# Altium footprint library SMT.PcbLib: 379 footprints (part 13 of 24)
Each footprint in its own frame and in the unit in brackets; x right, y up, seen from the top. Pads: shape width x height; smd on the part's side, far side on the other; paste and mask are expansions set on the pad; w line width, h text height; cw(c..) or ccw(c..) is an arc to the next point about the centre after c.
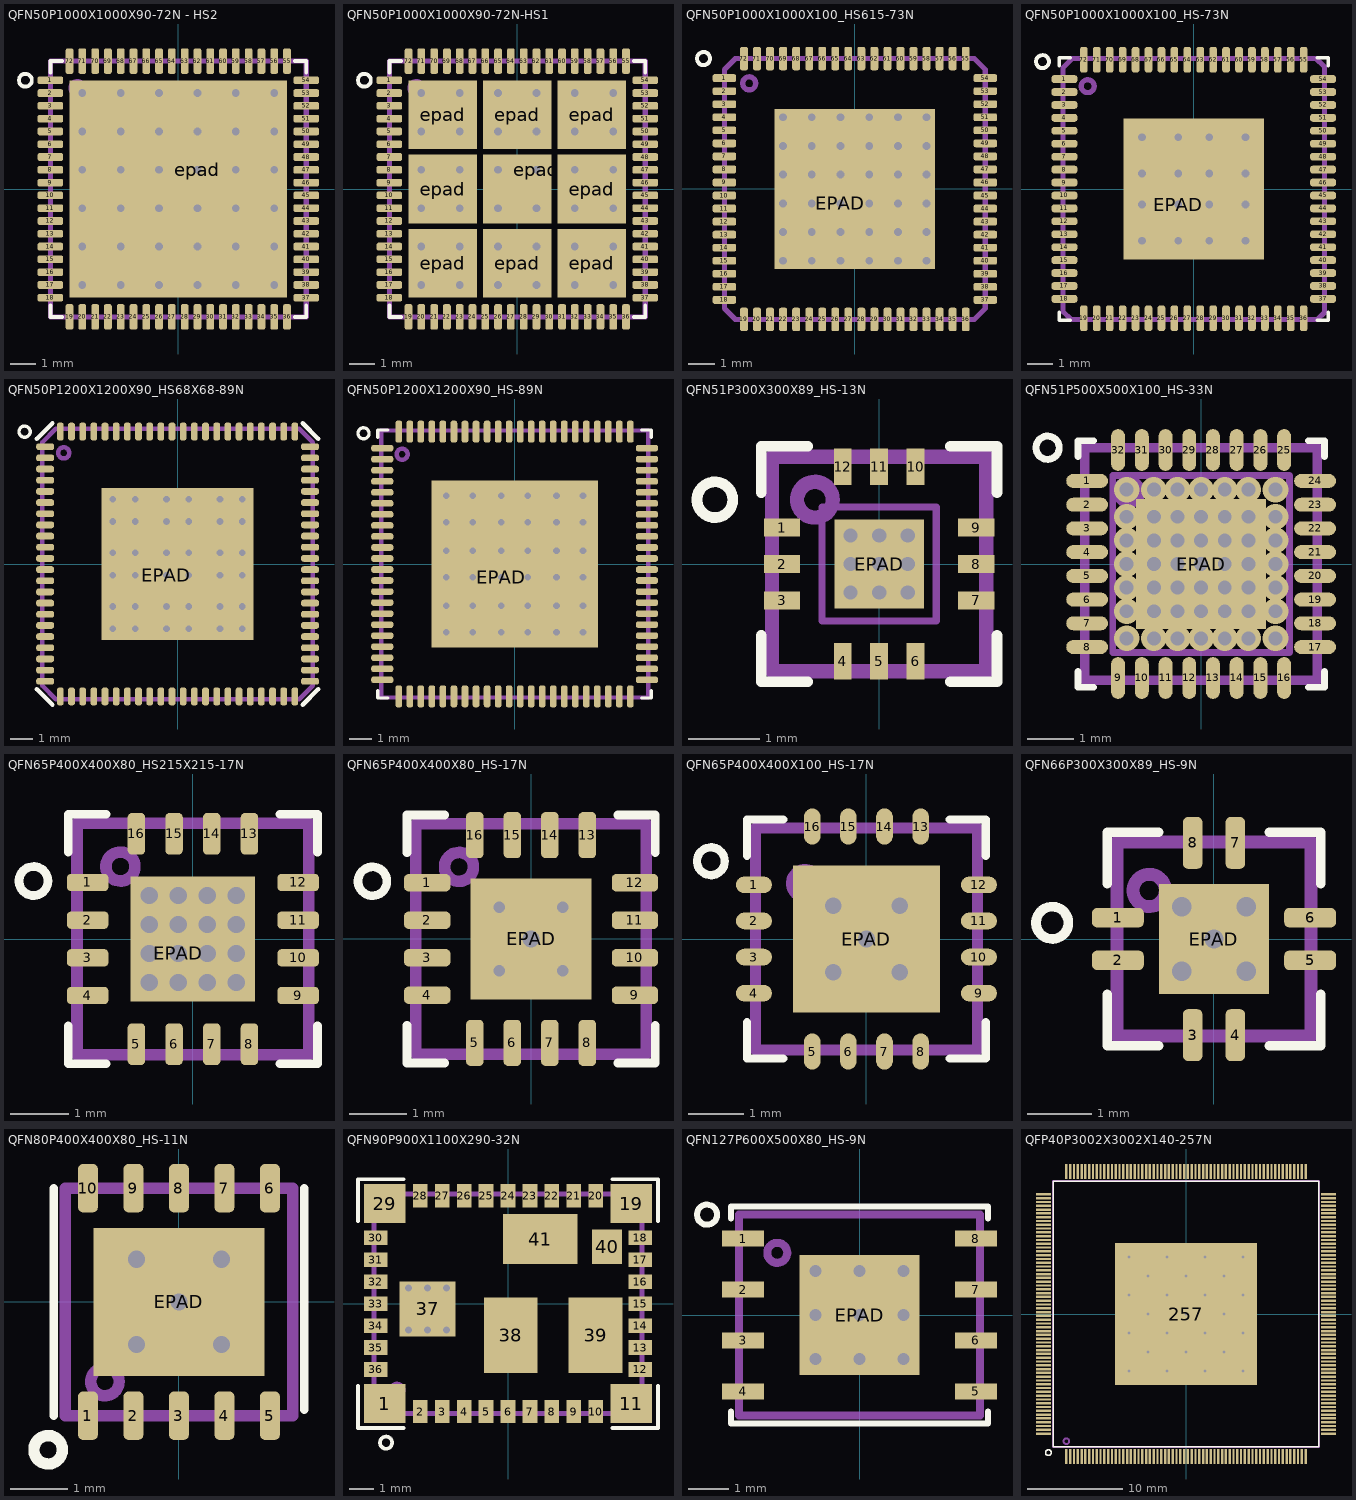
[diagram p12: the footprints below, top view; thin cyan lines are the x and y axes]

## QFN50P1000X1000X90-72N - HS2 [mm] "QFN, 72-Leads, Body 10,0x10,0mm (max), Pitch 0,50mm, IPC Medium Density"
height 0.9
pads (73):
  rrect50% 1x0.3 smd mask+0.03: 1(-5,4.25) 2(-5,3.75) 3(-5,3.25) 4(-5,2.75) 5(-5,2.25) 6(-5,1.75) 7(-5,1.25) 8(-5,0.75) 9(-5,0.25) 10(-5,-0.25) 11(-5,-0.75) 12(-5,-1.25) 13(-5,-1.75) 14(-5,-2.25) 15(-5,-2.75) 16(-5,-3.25) 17(-5,-3.75) 18(-5,-4.25) 37(5,-4.25) 38(5,-3.75) 39(5,-3.25) 40(5,-2.75) 41(5,-2.25) 42(5,-1.75) 43(5,-1.25) 44(5,-0.75) 45(5,-0.25) 46(5,0.25) 47(5,0.75) 48(5,1.25) 49(5,1.75) 50(5,2.25) 51(5,2.75) 52(5,3.25) 53(5,3.75) 54(5,4.25)
  rrect50% 0.3x1 smd mask+0.03: 19(-4.25,-5) 20(-3.75,-5) 21(-3.25,-5) 22(-2.75,-5) 23(-2.25,-5) 24(-1.75,-5) 25(-1.25,-5) 26(-0.75,-5) 27(-0.25,-5) 28(0.25,-5) 29(0.75,-5) 30(1.25,-5) 31(1.75,-5) 32(2.25,-5) 33(2.75,-5) 34(3.25,-5) 35(3.75,-5) 36(4.25,-5) 55(4.25,5) 56(3.75,5) 57(3.25,5) 58(2.75,5) 59(2.25,5) 60(1.75,5) 61(1.25,5) 62(0.75,5) 63(0.25,5) 64(-0.25,5) 65(-0.75,5) 66(-1.25,5) 67(-1.75,5) 68(-2.25,5) 69(-2.75,5) 70(-3.25,5) 71(-3.75,5) 72(-4.25,5)
  rect 8.5x8.5 hole 0.3 copper offset -0.75,-0.75 paste+0 mask-30: epad(0.75,0.75)
via -2.25,-0.75 diameter 0.6 hole 0.3
via -3.75,-0.75 diameter 0.6 hole 0.3
via -0.75,0.75 diameter 0.6 hole 0.3
via -0.75,-0.75 diameter 0.6 hole 0.3
via 0.75,-0.75 diameter 0.6 hole 0.3
via -2.25,0.75 diameter 0.6 hole 0.3
via -3.75,0.75 diameter 0.6 hole 0.3
via 2.25,0.75 diameter 0.6 hole 0.3
via 3.75,0.75 diameter 0.6 hole 0.3
via 2.25,-0.75 diameter 0.6 hole 0.3
via 3.75,-0.75 diameter 0.6 hole 0.3
via -3.75,2.25 diameter 0.6 hole 0.3
via -3.75,3.75 diameter 0.6 hole 0.3
via -2.25,2.25 diameter 0.6 hole 0.3
via -2.25,3.75 diameter 0.6 hole 0.3
via -0.75,2.25 diameter 0.6 hole 0.3
via -0.75,3.75 diameter 0.6 hole 0.3
via 0.75,2.25 diameter 0.6 hole 0.3
via 0.75,3.75 diameter 0.6 hole 0.3
via 2.25,2.25 diameter 0.6 hole 0.3
via 2.25,3.75 diameter 0.6 hole 0.3
via 3.75,2.25 diameter 0.6 hole 0.3
via 3.75,3.75 diameter 0.6 hole 0.3
via 3.75,-2.25 diameter 0.6 hole 0.3
via 3.75,-3.75 diameter 0.6 hole 0.3
via 2.25,-2.25 diameter 0.6 hole 0.3
via 2.25,-3.75 diameter 0.6 hole 0.3
via 0.75,-2.25 diameter 0.6 hole 0.3
via 0.75,-3.75 diameter 0.6 hole 0.3
via -0.75,-2.25 diameter 0.6 hole 0.3
via -0.75,-3.75 diameter 0.6 hole 0.3
via -2.25,-2.25 diameter 0.6 hole 0.3
via -2.25,-3.75 diameter 0.6 hole 0.3
via -3.75,-2.25 diameter 0.6 hole 0.3
via -3.75,-3.75 diameter 0.6 hole 0.3
Top Overlay:
  circle w0.15: c-5.975,4.25 r0.25
  lines w0.15: -5,-4.55 -5,-5 -4.55,-5 ; -5,4.55 -5,5 -4.55,5 ; 4.55,-5 5,-5 5,-4.55 ; 4.55,5 5,5 5,4.55
Top Paste:
  region: -1.05,-1.85 -1.05,-3.95 1.05,-3.95 1.05,-1.85
  region: 1.86,3.96 1.86,1.86 3.96,1.86 3.96,3.96
  region: -1.05,3.96 -1.05,1.86 1.05,1.86 1.05,3.96
  region: -3.94,3.96 -3.94,1.86 -1.84,1.86 -1.84,3.96
  region: -1.05,1.05 -1.05,-1.05 1.05,-1.05 1.05,1.05
  region: 1.86,1.05 1.86,-1.05 3.96,-1.05 3.96,1.05
  region: -3.94,1.05 -3.94,-1.05 -1.84,-1.05 -1.84,1.05
  region: 1.86,-1.85 1.86,-3.95 3.96,-3.95 3.96,-1.85
  region: -3.94,-1.85 -3.94,-3.95 -1.84,-3.95 -1.84,-1.85
Top Solder:
  region: -4.3,-1.52 -4.3,-4.3 -1.52,-4.3 -1.52,-1.52
  region: -1.39,-1.52 -1.39,-4.3 1.39,-4.3 1.39,-1.52
  region: 1.52,-1.52 1.52,-4.3 4.3,-4.3 4.3,-1.52
  region: 1.52,1.39 1.52,-1.39 4.3,-1.39 4.3,1.39
  region: 1.52,4.3 1.52,1.52 4.3,1.52 4.3,4.3
  region: -1.39,4.3 -1.39,1.52 1.39,1.52 1.39,4.3
  region: -4.3,4.3 -4.3,1.52 -1.52,1.52 -1.52,4.3
  region: -4.3,1.38 -4.3,-1.4 -1.52,-1.4 -1.52,1.38
  region: -1.39,1.39 -1.39,-1.39 1.39,-1.39 1.39,1.39
Bottom Solder:
  region: -4.25,4.25 4.25,4.25 4.25,-4.25 -4.25,-4.25
Mechanical 1:
  circle w0.2: c-3.95,3.95 r0.25
  lines w0.2: -5,-5 -5,5 5,5 5,-5 -5,-5
3D body: height 0.9, standoff 0.05, extent -5,-5 5,5

## QFN50P1000X1000X90-72N-HS1 [mm] "QFN, 72-Leads, Body 10,0x10,0mm (max), Pitch 0,50mm, IPC Medium Density"
height 0.9
pads (81):
  rrect50% 1x0.3 smd mask+0.03: 1(-5,4.25) 2(-5,3.75) 3(-5,3.25) 4(-5,2.75) 5(-5,2.25) 6(-5,1.75) 7(-5,1.25) 8(-5,0.75) 9(-5,0.25) 10(-5,-0.25) 11(-5,-0.75) 12(-5,-1.25) 13(-5,-1.75) 14(-5,-2.25) 15(-5,-2.75) 16(-5,-3.25) 17(-5,-3.75) 18(-5,-4.25) 37(5,-4.25) 38(5,-3.75) 39(5,-3.25) 40(5,-2.75) 41(5,-2.25) 42(5,-1.75) 43(5,-1.25) 44(5,-0.75) 45(5,-0.25) 46(5,0.25) 47(5,0.75) 48(5,1.25) 49(5,1.75) 50(5,2.25) 51(5,2.75) 52(5,3.25) 53(5,3.75) 54(5,4.25)
  rrect50% 0.3x1 smd mask+0.03: 19(-4.25,-5) 20(-3.75,-5) 21(-3.25,-5) 22(-2.75,-5) 23(-2.25,-5) 24(-1.75,-5) 25(-1.25,-5) 26(-0.75,-5) 27(-0.25,-5) 28(0.25,-5) 29(0.75,-5) 30(1.25,-5) 31(1.75,-5) 32(2.25,-5) 33(2.75,-5) 34(3.25,-5) 35(3.75,-5) 36(4.25,-5) 55(4.25,5) 56(3.75,5) 57(3.25,5) 58(2.75,5) 59(2.25,5) 60(1.75,5) 61(1.25,5) 62(0.75,5) 63(0.25,5) 64(-0.25,5) 65(-0.75,5) 66(-1.25,5) 67(-1.75,5) 68(-2.25,5) 69(-2.75,5) 70(-3.25,5) 71(-3.75,5) 72(-4.25,5)
  rect 2.68x2.68 smd paste-0.39 mask+0.05: epad(-2.91,-2.91) epad(-2.91,0) epad(-2.91,2.91) epad(0,-2.91) epad(0,2.91) epad(2.91,-2.91) epad(2.91,0) epad(2.91,2.91)
  rect 2.68x2.68 / inner rect 8.5x8.5 / far side rect 8.5x8.5 hole 0.3 copper offset -0.75,-0.75 paste+0 mask+0.05: epad(0.75,0.75)
via -3.75,-3.75 diameter 0.6 hole 0.3
via -3.75,-2.25 diameter 0.6 hole 0.3
via -2.25,-3.75 diameter 0.6 hole 0.3
via -2.25,-2.25 diameter 0.6 hole 0.3
via -0.75,-3.75 diameter 0.6 hole 0.3
via -0.75,-2.25 diameter 0.6 hole 0.3
via 0.75,-3.75 diameter 0.6 hole 0.3
via 0.75,-2.25 diameter 0.6 hole 0.3
via 2.25,-3.75 diameter 0.6 hole 0.3
via 2.25,-2.25 diameter 0.6 hole 0.3
via 3.75,-3.75 diameter 0.6 hole 0.3
via 3.75,-2.25 diameter 0.6 hole 0.3
via 3.75,3.75 diameter 0.6 hole 0.3
via 3.75,2.25 diameter 0.6 hole 0.3
via 2.25,3.75 diameter 0.6 hole 0.3
via 2.25,2.25 diameter 0.6 hole 0.3
via 0.75,3.75 diameter 0.6 hole 0.3
via 0.75,2.25 diameter 0.6 hole 0.3
via -0.75,3.75 diameter 0.6 hole 0.3
via -0.75,2.25 diameter 0.6 hole 0.3
via -2.25,3.75 diameter 0.6 hole 0.3
via -2.25,2.25 diameter 0.6 hole 0.3
via -3.75,3.75 diameter 0.6 hole 0.3
via -3.75,2.25 diameter 0.6 hole 0.3
via 3.75,-0.75 diameter 0.6 hole 0.3
via 2.25,-0.75 diameter 0.6 hole 0.3
via 3.75,0.75 diameter 0.6 hole 0.3
via 2.25,0.75 diameter 0.6 hole 0.3
via -3.75,0.75 diameter 0.6 hole 0.3
via -2.25,0.75 diameter 0.6 hole 0.3
via 0.75,-0.75 diameter 0.6 hole 0.3
via -0.75,-0.75 diameter 0.6 hole 0.3
via -0.75,0.75 diameter 0.6 hole 0.3
via -3.75,-0.75 diameter 0.6 hole 0.3
via -2.25,-0.75 diameter 0.6 hole 0.3
Top Overlay:
  circle w0.15: c-5.975,4.25 r0.25
  lines w0.15: -5,-4.55 -5,-5 -4.55,-5 ; -5,4.55 -5,5 -4.55,5 ; 4.55,-5 5,-5 5,-4.55 ; 4.55,5 5,5 5,4.55
Top Paste:
  region: -0.95,0.95 -0.95,-0.95 0.95,-0.95 0.95,0.95
Top Solder:
  rectangle: -5,-5 -4.375,-4.375
  region: 5,-5 5,-4.375 4.375,-4.375 4.375,-5
  region: 5,5 4.375,5 4.375,4.375 5,4.375
  region: -5,5 -5,4.375 -4.375,4.375 -4.375,5
Bottom Solder:
  region: -4.25,4.25 4.25,4.25 4.25,-4.25 -4.25,-4.25
Mechanical 1:
  circle w0.2: c-3.95,3.95 r0.25
  lines w0.2: -5,-5 5,-5 5,5 -5,5 -5,-5
3D body: height 0.9, standoff 0.05, extent -5,-5 5,5

## QFN50P1000X1000X100_HS615-73N [mm] "QFN, 72-Leads, Body 10,00x10,00mm, Pitch 0,50mm, Thermal Pad 6,15x6,15mm, IPC Medium Density"
height 1
pads (73):
  rrect50% 0.9x0.3 smd mask+0.05: 1(-5,4.25) 2(-5,3.75) 3(-5,3.25) 4(-5,2.75) 5(-5,2.25) 6(-5,1.75) 7(-5,1.25) 8(-5,0.75) 9(-5,0.25) 10(-5,-0.25) 11(-5,-0.75) 12(-5,-1.25) 13(-5,-1.75) 14(-5,-2.25) 15(-5,-2.75) 16(-5,-3.25) 17(-5,-3.75) 18(-5,-4.25) 37(5,-4.25) 38(5,-3.75) 39(5,-3.25) 40(5,-2.75) 41(5,-2.25) 42(5,-1.75) 43(5,-1.25) 44(5,-0.75) 45(5,-0.25) 46(5,0.25) 47(5,0.75) 48(5,1.25) 49(5,1.75) 50(5,2.25) 51(5,2.75) 52(5,3.25) 53(5,3.75) 54(5,4.25)
  rrect50% 0.3x0.9 smd mask+0.05: 19(-4.25,-5) 20(-3.75,-5) 21(-3.25,-5) 22(-2.75,-5) 23(-2.25,-5) 24(-1.75,-5) 25(-1.25,-5) 26(-0.75,-5) 27(-0.25,-5) 28(0.25,-5) 29(0.75,-5) 30(1.25,-5) 31(1.75,-5) 32(2.25,-5) 33(2.75,-5) 34(3.25,-5) 35(3.75,-5) 36(4.25,-5) 55(4.25,5) 56(3.75,5) 57(3.25,5) 58(2.75,5) 59(2.25,5) 60(1.75,5) 61(1.25,5) 62(0.75,5) 63(0.25,5) 64(-0.25,5) 65(-0.75,5) 66(-1.25,5) 67(-1.75,5) 68(-2.25,5) 69(-2.75,5) 70(-3.25,5) 71(-3.75,5) 72(-4.25,5)
  rect 6.15x6.15 hole 0.3 copper offset 0.55,0.55 mask+0.05: EPAD(-0.55,-0.55)
via 2.75,2.75 diameter 0.6 hole 0.3
via 2.75,-2.75 diameter 0.6 hole 0.3
via 1.65,-2.75 diameter 0.6 hole 0.3
via 0.55,-2.75 diameter 0.6 hole 0.3
via -0.55,-2.75 diameter 0.6 hole 0.3
via -1.65,-2.75 diameter 0.6 hole 0.3
via -2.75,-2.75 diameter 0.6 hole 0.3
via 2.75,-1.65 diameter 0.6 hole 0.3
via 1.65,-1.65 diameter 0.6 hole 0.3
via 0.55,-1.65 diameter 0.6 hole 0.3
via -0.55,-1.65 diameter 0.6 hole 0.3
via -1.65,-1.65 diameter 0.6 hole 0.3
via -2.75,-1.65 diameter 0.6 hole 0.3
via 2.75,-0.55 diameter 0.6 hole 0.3
via 1.65,-0.55 diameter 0.6 hole 0.3
via 0.55,-0.55 diameter 0.6 hole 0.3
via -1.65,-0.55 diameter 0.6 hole 0.3
via -2.75,-0.55 diameter 0.6 hole 0.3
via 2.75,0.55 diameter 0.6 hole 0.3
via 1.65,0.55 diameter 0.6 hole 0.3
via 0.55,0.55 diameter 0.6 hole 0.3
via -0.55,0.55 diameter 0.6 hole 0.3
via -1.65,0.55 diameter 0.6 hole 0.3
via -2.75,0.55 diameter 0.6 hole 0.3
via 2.75,1.65 diameter 0.6 hole 0.3
via 1.65,1.65 diameter 0.6 hole 0.3
via 0.55,1.65 diameter 0.6 hole 0.3
via -0.55,1.65 diameter 0.6 hole 0.3
via -1.65,1.65 diameter 0.6 hole 0.3
via -2.75,1.65 diameter 0.6 hole 0.3
via 1.65,2.75 diameter 0.6 hole 0.3
via 0.55,2.75 diameter 0.6 hole 0.3
via -0.55,2.75 diameter 0.6 hole 0.3
via -1.65,2.75 diameter 0.6 hole 0.3
via -2.75,2.75 diameter 0.6 hole 0.3
Top Overlay:
  circle w0.15: c-5.8,5 r0.25
Top Paste:
  rectangle: -2.5,0.5 -0.5,2.5
  rectangle: -2.5,-2.5 -0.5,-0.5
  region: 2.5,-0.5 0.5,-0.5 0.5,-2.5 2.5,-2.5
  region: 2.5,2.5 0.5,2.5 0.5,0.5 2.5,0.5
Top Solder:
  region: 2.8,-2.8 0.2,-2.8 0.2,-0.2 2.8,-0.2
  region: -2.8,-2.8 -0.2,-2.8 -0.2,-0.2 -2.8,-0.2
  region: -2.8,2.8 -0.2,2.8 -0.2,0.2 -2.8,0.2
  region: 2.8,2.8 0.2,2.8 0.2,0.2 2.8,0.2
Mechanical 1:
  circle w0.2: c-4.05,4.05 r0.25
  lines w0.2: -5,-4.58 -5,4.58 -4.58,5 4.58,5 5,4.58 5,-4.58 4.58,-5 -4.58,-5 -5,-4.58
3D body "QFN50P1000X1000X100_HS-73N.step": height 1, standoff 0, extent -5.02,-5.02 5.02,5.02

## QFN50P1000X1000X100_HS-73N [mm] "QFN, 72-Leads, Body 10,00x10,00mm, Pitch 0,50mm, Thermal Pad 5,45x5,45mm, IPC Medium Density"
height 1
pads (73):
  rrect70% 1x0.3 smd paste+0 mask+0.03: 1(-5,4.25) 18(-5,-4.25) 37(5,-4.25) 54(5,4.25)
  rrect70% 1x0.3 smd paste+0 mask+0.04: 2(-5,3.75) 3(-5,3.25) 4(-5,2.75) 5(-5,2.25) 6(-5,1.75) 7(-5,1.25) 8(-5,0.75) 9(-5,0.25) 10(-5,-0.25) 11(-5,-0.75) 12(-5,-1.25) 13(-5,-1.75) 14(-5,-2.25) 15(-5,-2.75) 16(-5,-3.25) 17(-5,-3.75) 38(5,-3.75) 39(5,-3.25) 40(5,-2.75) 41(5,-2.25) 42(5,-1.75) 43(5,-1.25) 44(5,-0.75) 45(5,-0.25) 46(5,0.25) 47(5,0.75) 48(5,1.25) 49(5,1.75) 50(5,2.25) 51(5,2.75) 52(5,3.25) 53(5,3.75)
  rrect70% 0.3x1 smd paste+0 mask+0.03: 19(-4.25,-5) 36(4.25,-5) 55(4.25,5) 72(-4.25,5)
  rrect70% 0.3x1 smd paste+0 mask+0.04: 20(-3.75,-5) 21(-3.25,-5) 22(-2.75,-5) 23(-2.25,-5) 24(-1.75,-5) 25(-1.25,-5) 26(-0.75,-5) 27(-0.25,-5) 28(0.25,-5) 29(0.75,-5) 30(1.25,-5) 31(1.75,-5) 32(2.25,-5) 33(2.75,-5) 34(3.25,-5) 35(3.75,-5) 56(3.75,5) 57(3.25,5) 58(2.75,5) 59(2.25,5) 60(1.75,5) 61(1.25,5) 62(0.75,5) 63(0.25,5) 64(-0.25,5) 65(-0.75,5) 66(-1.25,5) 67(-1.75,5) 68(-2.25,5) 69(-2.75,5) 70(-3.25,5) 71(-3.75,5)
  rect 5.45x5.45 hole 0.3 copper offset 0.6,0.6 mask-20: EPAD(-0.6,-0.6)
via 2,-2 diameter 0.7 hole 0.3
via 0.6,-2 diameter 0.7 hole 0.3
via -0.6,-2 diameter 0.7 hole 0.3
via -2,-2 diameter 0.7 hole 0.3
via 2,2 diameter 0.7 hole 0.3
via 0.6,2 diameter 0.7 hole 0.3
via -0.6,2 diameter 0.7 hole 0.3
via -2,2 diameter 0.7 hole 0.3
via -0.6,0.6 diameter 0.7 hole 0.3
via -2,0.6 diameter 0.7 hole 0.3
via -2,-0.6 diameter 0.7 hole 0.3
via 2,-0.6 diameter 0.7 hole 0.3
via 2,0.6 diameter 0.7 hole 0.3
via 0.6,0.6 diameter 0.7 hole 0.3
via 0.6,-0.6 diameter 0.7 hole 0.3
Top Overlay:
  circle w0.15: c-5.85,4.925 r0.25
  lines w0.15: -5.2,-4.775 -5.2,-5.075 -4.775,-5.075 ; -5.2,4.775 -5.2,5.075 -4.775,5.075 ; 4.775,-5.075 5.2,-5.075 5.2,-4.775 ; 4.775,5.075 5.2,5.075 5.2,4.775
Top Paste:
  rectangle: 0.3,-2.3 2.3,-0.3
  rectangle: -2.3,-2.3 -0.3,-0.3
  rectangle: 0.3,0.3 2.3,2.3
  rectangle: -2.3,0.3 -0.3,2.3
Top Solder:
  region: -2.45,2.45 -0.15,2.45 -0.15,0.15 -2.45,0.15
  region: -2.45,-0.15 -0.15,-0.15 -0.15,-2.45 -2.45,-2.45
  region: 0.15,2.45 2.45,2.45 2.45,0.15 0.15,0.15
  region: 0.15,-0.15 2.45,-0.15 2.45,-2.45 0.15,-2.45
Bottom Solder:
  rectangle: -2.75,-2.75 2.75,2.75
Mechanical 1:
  circle w0.2: c-4.1,3.975 r0.25
  lines w0.2: -5.05,-4.75 -5.05,4.7 -4.7,5.05 4.725,5.05 5.05,4.725 5.05,-4.775 4.775,-5.05 -4.75,-5.05 -5.05,-4.75
3D body "QFN50P1000X975X100_HS-73N.step": height 1, standoff 0, extent -5.02,-4.895 5.02,4.895

## QFN50P1200X1200X90_HS68X68-89N [mm] "QFN, 88-Leads, Body 12,00x12,00mm, Pitch 0,50mm, Thermal Pad 6,8x6,8mm, IPC Medium Density"
height 0.9
pads (89):
  rrect70% 0.8x0.3 smd paste+0 mask+0.04: 1(-5.93,5.25) 2(-5.93,4.75) 3(-5.93,4.25) 4(-5.93,3.75) 5(-5.93,3.25) 6(-5.93,2.75) 7(-5.93,2.25) 8(-5.93,1.75) 9(-5.93,1.25) 10(-5.93,0.75) 11(-5.93,0.25) 12(-5.93,-0.25) 13(-5.93,-0.75) 14(-5.93,-1.25) 15(-5.93,-1.75) 16(-5.93,-2.25) 17(-5.93,-2.75) 18(-5.93,-3.25) 19(-5.93,-3.75) 20(-5.93,-4.25) 21(-5.93,-4.75) 22(-5.93,-5.25) 45(5.93,-5.25) 46(5.93,-4.75) 47(5.93,-4.25) 48(5.93,-3.75) 49(5.93,-3.25) 50(5.93,-2.75) 51(5.93,-2.25) 52(5.93,-1.75) 53(5.93,-1.25) 54(5.93,-0.75) 55(5.93,-0.25) 56(5.93,0.25) 57(5.93,0.75) 58(5.93,1.25) 59(5.93,1.75) 60(5.93,2.25) 61(5.93,2.75) 62(5.93,3.25) 63(5.93,3.75) 64(5.93,4.25) 65(5.93,4.75) 66(5.93,5.25)
  rrect70% 0.3x0.8 smd paste+0 mask+0.04: 23(-5.25,-5.93) 24(-4.75,-5.93) 25(-4.25,-5.93) 26(-3.75,-5.93) 27(-3.25,-5.93) 28(-2.75,-5.93) 29(-2.25,-5.93) 30(-1.75,-5.93) 31(-1.25,-5.93) 32(-0.75,-5.93) 33(-0.25,-5.93) 34(0.25,-5.93) 35(0.75,-5.93) 36(1.25,-5.93) 37(1.75,-5.93) 38(2.25,-5.93) 39(2.75,-5.93) 40(3.25,-5.93) 41(3.75,-5.93) 42(4.25,-5.93) 43(4.75,-5.93) 44(5.25,-5.93) 67(5.25,5.93) 68(4.75,5.93) 69(4.25,5.93) 70(3.75,5.93) 71(3.25,5.93) 72(2.75,5.93) 73(2.25,5.93) 74(1.75,5.93) 75(1.25,5.93) 76(0.75,5.93) 77(0.25,5.93) 78(-0.25,5.93) 79(-0.75,5.93) 80(-1.25,5.93) 81(-1.75,5.93) 82(-2.25,5.93) 83(-2.75,5.93) 84(-3.25,5.93) 85(-3.75,5.93) 86(-4.25,5.93) 87(-4.75,5.93) 88(-5.25,5.93)
  rect 6.8x6.8 hole 0.3 copper offset 0.5,0.5 mask-20: EPAD(-0.5,-0.5)
via -2.9,2.9 diameter 0.6 hole 0.3
via -1.9,2.9 diameter 0.6 hole 0.3
via -2.9,1.9 diameter 0.6 hole 0.3
via -1.9,1.9 diameter 0.6 hole 0.3
via 0.5,1.9 diameter 0.6 hole 0.3
via -0.5,1.9 diameter 0.6 hole 0.3
via 0.5,2.9 diameter 0.6 hole 0.3
via -0.5,2.9 diameter 0.6 hole 0.3
via 0.5,-0.5 diameter 0.6 hole 0.3
via 0.5,0.5 diameter 0.6 hole 0.3
via -0.5,0.5 diameter 0.6 hole 0.3
via -1.9,-0.5 diameter 0.6 hole 0.3
via -2.9,-0.5 diameter 0.6 hole 0.3
via -1.9,0.5 diameter 0.6 hole 0.3
via -2.9,0.5 diameter 0.6 hole 0.3
via -1.9,-2.9 diameter 0.6 hole 0.3
via -2.9,-2.9 diameter 0.6 hole 0.3
via -1.9,-1.9 diameter 0.6 hole 0.3
via -2.9,-1.9 diameter 0.6 hole 0.3
via 0.5,-2.9 diameter 0.6 hole 0.3
via -0.5,-2.9 diameter 0.6 hole 0.3
via 0.5,-1.9 diameter 0.6 hole 0.3
via -0.5,-1.9 diameter 0.6 hole 0.3
via 2.9,-2.9 diameter 0.6 hole 0.3
via 1.9,-2.9 diameter 0.6 hole 0.3
via 2.9,-1.9 diameter 0.6 hole 0.3
via 1.9,-1.9 diameter 0.6 hole 0.3
via 2.9,-0.5 diameter 0.6 hole 0.3
via 1.9,-0.5 diameter 0.6 hole 0.3
via 2.9,0.5 diameter 0.6 hole 0.3
via 1.9,0.5 diameter 0.6 hole 0.3
via 2.9,1.9 diameter 0.6 hole 0.3
via 1.9,1.9 diameter 0.6 hole 0.3
via 2.9,2.9 diameter 0.6 hole 0.3
via 1.9,2.9 diameter 0.6 hole 0.3
Top Overlay:
  circle w0.15: c-6.85,5.925 r0.25
  lines w0.2: -6.3,-5.6 -5.6,-6.3 ; -6.3,5.6 -5.6,6.3 ; 5.6,-6.3 6.3,-5.6 ; 5.6,6.3 6.3,5.6
Top Paste:
  region: 1.4,-1.4 3.4,-1.4 3.4,-3.4 1.4,-3.4
  region: -1.04,-1.4 1.04,-1.4 1.04,-3.4 -1.04,-3.4
  region: -3.4,-1.4 -1.4,-1.4 -1.4,-3.4 -3.4,-3.4
  region: -3.4,1.04 -1.4,1.04 -1.4,-1.04 -3.4,-1.04
  region: -1.04,1.04 1.04,1.04 1.04,-1.04 -1.04,-1.04
  region: 1.4,1.04 3.4,1.04 3.4,-1.04 1.4,-1.04
  region: -3.4,3.4 -1.4,3.4 -1.4,1.4 -3.4,1.4
  region: -1.04,3.4 1.04,3.4 1.04,1.4 -1.04,1.4
  region: 1.4,3.4 3.4,3.4 3.4,1.4 1.4,1.4
Top Solder:
  region: 1.28,-1.28 3.52,-1.28 3.52,-3.52 1.28,-3.52
  region: -1.16,-1.28 1.16,-1.28 1.16,-3.52 -1.16,-3.52
  region: -3.52,-1.28 -1.28,-1.28 -1.28,-3.52 -3.52,-3.52
  region: 1.28,1.16 3.52,1.16 3.52,-1.16 1.28,-1.16
  region: 1.28,3.52 3.52,3.52 3.52,1.28 1.28,1.28
  region: -3.52,3.52 -1.28,3.52 -1.28,1.28 -3.52,1.28
  region: -1.16,3.52 1.16,3.52 1.16,1.28 -1.16,1.28
  region: -1.16,1.16 1.16,1.16 1.16,-1.16 -1.16,-1.16
  region: -3.52,1.16 -1.28,1.16 -1.28,-1.16 -3.52,-1.16
Bottom Solder:
  region: -3.52,3.52 3.52,3.52 3.52,-3.52 -3.52,-3.52
Mechanical 1:
  circle w0.2: c-5.1,4.975 r0.25
  lines w0.2: 5.45,6.05 6.05,5.45 ; 5.45,6.05 -5.45,6.05 -6.05,5.45 -6.05,-5.45 -5.45,-6.05 5.45,-6.05 6.05,-5.45 6.05,5.45 ; 5.45,6.05 6.05,5.45
3D body "Микросхема AD9914BCPZ.stp": height 0.8, standoff 0, extent -6.01,-6.01 6.05,6.05
